# Altium schematic symbol library CUSTOM SCH - Copy.SchLib: 494 symbols (part 5 of 6) (continued)
## TPS62291DRVR
designator U?
Switching Voltage Regulators 2.25MHz 1A Step-Down Converter; Manufacturer: Texas Instruments; Output Voltage: 3.3V; Number of Outputs: 1; Max Input Voltage: 6V; Min Input Voltage: 2.3V; Synchronous Rectifier: Yes; Quiescent Current: 15uA; Output Type: Fixed; Output Configuration: Positive; Supplier 1: Digi-Key; Stock 1: 0; Number of Pins: 6; Weight: 0.000342oz; Min Operating Temperature: -40°C; Max Operating Temperature: 85°C; Switching Frequency: 2.25MHz; Output Current: 1A; Packaging: Tape and Reel; Package Quantity: 3000; Max Output Current: 1A; Min Output Voltage: 3.3V; Max Output Voltage: 3.3V; Operating Supply Voltage: 6V; Lead Free: Lead Free; ComponentLink1URL: http://www.ti.com/lit/ds/symlink/tps62293.pdf?src-supplier=Digi-Key; ComponentLink1Description: http://www.ti.com/lit/ds/symlink/tps62293.pdf?src-supplier=Digi-Key; ComponentLink2URL: http://www.ti.com/general/docs/lit/getliterature.tsp?genericPartNumber=TPS62291&&fileType=pdf&src-supplier=Avnet; ComponentLink2Description: http://www.ti.com/general/docs/lit/getliterature.tsp?genericPartNumber=TPS62291&&fileType=pdf&src-supplier=Avnet; ComponentLink3URL: http://components.arrow.com/part/dataview/43980678S8271694N7713?src-supplier=Arrow; ComponentLink3Description: http://components.arrow.com/part/dataview/43980678S8271694N7713?src-supplier=Arrow; Supplier Part Number 1: TPS62291DRVR-ND; Manufacturer Part Number: TPS62291DRVR
footprint WSON-6
pins: 1 SW, 2 MODE, 3 FB, 4 EN, 5 VIN (power), 6 GND (power), 7 EPAD

## TPS62827DMQR
designator U?
Manufacturer: Texas Instruments; Manufacturer Part Number: TPS62827DMQR; Pricing 1: 3000=0.8242, 6000=0.7925 (USD); Case/Package: VSON-6
footprint VSON-6
pins: 1 EN, 2 PG, 3 FB, 4 GND, 5 SW, 6 VIN

## TPS63021DSJR
designator U?
High Efficiency Single Inductor 3.3V, 2A Buck-Boost Converter with 4A Switching Current; Manufacturer Part Number: TPS63021DSJR; Case/Package: None
footprint TPS63021DSJR (TPS63021)
pins: 1 VINA (in), 2 GND (power), 3 FB (in), 4 VOUT_4 (out), 5 VOUT_5 (out), 6 L2_6, 7 L2_7, 8 L1_8, 9 L1_9, 10 VIN_10 (in), 11 VIN_11 (in), 12 EN (in), 13 PS/SYNC (in), 14 PG (out), 15 PGND (power)

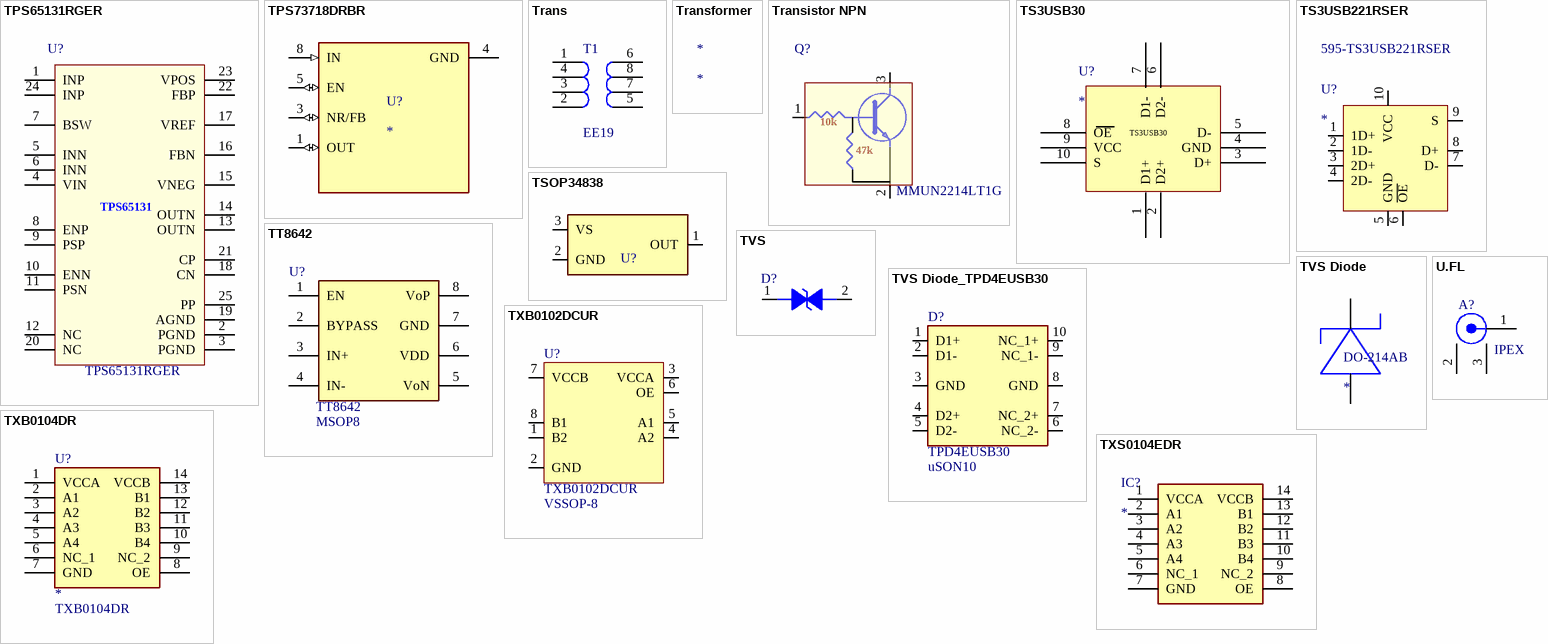
[diagram p42: symbols TPS65131RGER to U.FL]

## TPS65131RGER
designator U?  Manufacturer Part Number: TPS65131RGER
Positive and Negative Output DC-DC Converter; Manufacturer: Texas Instruments; Output Voltage: 15V; Output Current: 1.95A; Operating Supply Voltage: 5.5V; Number of Outputs: 2; Efficiency: 85%; Switching Frequency: 1.4MHz; Min Input Voltage: 2.7V; Synchronous Rectifier: No; Min Output Voltage: -15V; Quiescent Current: 500uA; Topology: Buck-Boost; Output Type: Adjustable; Supplier 1: Digi-Key; RoHS: Yes; Category: Voltage Regulators - Switching; Stock 1: 2825; Pricing 1: 1=2.80000, 10=2.51300, 25=2.37600, 100=1.95360, 250=1.75296, 500=1.68960, 1000=1.40448 (USD); Case/Package: VQFN-24; Number of Pins: 24; Weight: 0.001524oz; Min Operating Temperature: -40°C; Max Operating Temperature: 85°C; Package Quantity: 3000; Packaging: Tape and Reel; Max Input Voltage: 5.5V; Max Output Voltage: 15V; Radiation Hardening: No; Lead Free: Lead Free; ComponentLink1URL: https://datasheet.ciiva.com/4119/40762122s8213930n7713-4119696.pdf?src-supplier=Arrow+Electronics; ComponentLink1Description: https://datasheet.ciiva.com/4119/40762122s8213930n7713-4119696.pdf?src-supplier=Arrow+Electronics; ComponentLink2URL: https://datasheet.ciiva.com/2035/tps65130-2035332.pdf?src-supplier=Digi-Key; ComponentLink2Description: https://datasheet.ciiva.com/2035/tps65130-2035332.pdf?src-supplier=Digi-Key; ComponentLink3URL: https://datasheet.ciiva.com/15223/getdatasheetpartid-254483-15223079.pdf?src-supplier=Verical; ComponentLink3Description: https://datasheet.ciiva.com/15223/getdatasheetpartid-254483-15223079.pdf?src-supplier=Verical; ComponentLink4URL: https://datasheet.ciiva.com/14378/tps65130-14378346.pdf?src-supplier=Avnet; ComponentLink4Description: https://datasheet.ciiva.com/14378/tps65130-14378346.pdf?src-supplier=Avnet
pins: 1 INP, 2 PGND, 3 PGND, 4 VIN, 5 INN, 6 INN, 7 BSW, 8 ENP, 9 PSP, 10 ENN, 11 PSN, 12 NC, 13 OUTN, 14 OUTN, 15 VNEG, 16 FBN, 17 VREF, 18 CN, 19 AGND, 20 NC, 21 CP, 22 FBP, 23 VPOS, 24 INP, 25 PP
text: TPS65131

## TPS73718DRBR
designator U?
Manufacturer Part Number: TPS73718DRBR; Case/Package: SMD DRBR; Value: *
footprint DRV8601DRBT (TPS73718DRBR)
pins: 1 OUT (io), 3 NR/FB (io), 4 GND (power), 5 EN (io), 8 IN (in)

## Trans
designator T1, comment EE19
Transformer; Published: 24-Mar-1999; LatestRevisionDate: 08-Jul-2005; LatestRevisionNote: Mech Layer 1 removed.; PackageReference: TRANS; Publisher: Altium Limited; PackageDescription: Transformer; 4 Leads
footprint EE19 Transformer (DC/DC  converte)
footprint EE19 Transformer (DC/DC  converte)
pins: 1, 2, 3, 4 3, 5, 6, 7, 8

## Transformer
designator *

## Transistor NPN
designator Q?  Manufacturer Part Number: MMUN2214LT1G
Bipolar Transistors - Pre-Biased 100mA 50V BRT NPN; Manufacturer: ON Semiconductor; Max Power Dissipation: 246mW; hFE Min: 80; Collector Emitter Saturation Voltage: 250mV; Element Configuration: Single; Supplier 1: Mouser; Stock 1: 56410; Pricing 1: 1=0.12, 10=0.105, 50=0.105, 100=0.037, 1000=0.025, 10000=0.017 (USD); Case/Package: SOT-23-3; Number of Pins: 3; Contact Plating: Tin,Matte; Min Operating Temperature: -55°C; Max Operating Temperature: 150°C; Package Quantity: 1; Collector Emitter Voltage (VCEO): 50V; Packaging: Tape and Reel; Max Collector Current: 100mA; Collector Emitter Breakdown Voltage: 50V; Polarity: NPN; Max Breakdown Voltage: 50V; Max Output Current: 100mA; Operating Supply Voltage: 50V; Continuous Collector Current: 100mA; Power Dissipation: 246mW; Voltage Rating (DC): 50V; Current Rating: 100mA; Length: 2.9mm; Height: 0.94mm; Width: 1.3mm; Radiation Hardening: No; Lead Free: Lead Free; Halogen Free: Halogen Free; REACH SVHC: No SVHC; ComponentLink1URL: http://www.onsemi.ru.com/pub/Collateral/DTC114Y-D.PDF?src-supplier=Avnet+Europe; ComponentLink1Description: http://www.onsemi.ru.com/pub/Collateral/DTC114Y-D.PDF?src-supplier=Avnet+Europe; ComponentLink2URL: https://www.verical.com/server-webapp/html/getDatasheet?partID=38473&src-supplier=Verical; ComponentLink2Description: https://www.verical.com/server-webapp/html/getDatasheet?partID=38473&src-supplier=Verical; ComponentLink3URL: http://www.onsemi.com/pub/Collateral/DTC114Y-D.PDF?src-supplier=Digi-Key; ComponentLink3Description: http://www.onsemi.com/pub/Collateral/DTC114Y-D.PDF?src-supplier=Digi-Key; ComponentLink4URL: http://www.onsemi.com/pub/Collateral/DTC114Y-D.PDF?src-supplier=Future+Electronics; ComponentLink4Description: http://www.onsemi.com/pub/Collateral/DTC114Y-D.PDF?src-supplier=Future+Electronics; Supplier Part Number 1: 863-MMUN2214LT1G
footprint SOT95P240X115-3N
pins: 1 B, 2 E, 3 C
text: 10k; 47k

## TS3USB30
designator U?
ComponentLink1URL: http://www.ti.com/lit/ds/symlink/ts3usb30e.pdf?src-supplier=Digi-Key; ComponentLink1Description: http://www.ti.com/lit/ds/symlink/ts3usb30e.pdf?src-supplier=Digi-Key; ComponentLink2URL: http://www.farnell.com/datasheets/1719749.pdf?src-supplier=Element14; ComponentLink2Description: http://www.farnell.com/datasheets/1719749.pdf?src-supplier=Element14; ComponentLink3URL: http://focus.ti.com/lit/ds/symlink/ts3usb30e.pdf?src-supplier=Avnet; ComponentLink3Description: http://focus.ti.com/lit/ds/symlink/ts3usb30e.pdf?src-supplier=Avnet; ComponentLink4URL: https://www.verical.com/server-webapp/html/getDatasheet?partID=298587&src-supplier=Verical; ComponentLink4Description: https://www.verical.com/server-webapp/html/getDatasheet?partID=298587&src-supplier=Verical; ComponentLink5URL: http://focus.ti.com/lit/ds/symlink/ts3usb30e.pdf?src-supplier=Avnet+Europe; ComponentLink5Description: http://focus.ti.com/lit/ds/symlink/ts3usb30e.pdf?src-supplier=Avnet+Europe; ComponentLink6URL: http://www.farnell.com/datasheets/1882195.pdf?src-supplier=Element14; ComponentLink6Description: http://www.farnell.com/datasheets/1882195.pdf?src-supplier=Element14; ComponentLink7URL: http://datasheet.iiic.cc/texas_instruments/TS3USB30ERSWR.pdf?src-supplier=IIIC; ComponentLink7Description: http://datasheet.iiic.cc/texas_instruments/TS3USB30ERSWR.pdf?src-supplier=IIIC; ComponentLink8URL: http://www.produktinfo.conrad.com/datenblaetter/1100000-1199999/001187336-da-01-en-IC_USB_SWITCH_TS3USB30ERSWR_UQFN_10_TID.pdf?src-supplier=Conrad; ComponentLink8Description: http://www.produktinfo.conrad.com/datenblaetter/1100000-1199999/001187336-da-01-en-IC_USB_SWITCH_TS3USB30ERSWR_UQFN_10_TID.pdf?src-supplier=Conrad; ComponentLink9URL: http://www.ti.com/lit/ds/scds220g/scds220g.pdf?src-supplier=Avnet; ComponentLink9Description: http://www.ti.com/lit/ds/scds220g/scds220g.pdf?src-supplier=Avnet; ComponentLink10URL: http://www.ti.com/lit/ds/symlink/ts3usb221.pdf?src-supplier=Digi-Key; ComponentLink10Description: http://www.ti.com/lit/ds/symlink/ts3usb221.pdf?src-supplier=Digi-Key
footprint UQFN_TS3USB30
pins: 1 D1+, 2 D2+, 3 D+, 4 GND, 5 D-, 6 D2-, 7 D1-, 8 OE, 9 VCC, 10 S

## TS3USB221RSER
designator U?  Supplier Part Number 1: 595-TS3USB221RSER
USB Switch ICs Hi-Sp USB 2.0 1:2 Multipl/Demult Sw; Manufacturer: Texas Instruments; Manufacturer Part Number: TS3USB221RSER; Data Rate: 480Mbps; Number of Channels: 2; Min Supply Voltage: 2.3V; Max Supply Voltage: 3.6V; Bandwidth: 1.1GHz; Number of Inputs: 4; Operating Supply Voltage: 3V; Nominal Supply Current: 30uA; Turn-Off Delay Time: 12ns; On-State Resistance: 6R; Turn-On Delay Time: 30ns; Supply Type: Single; High Level Output Current: 64mA; USB Standard: USB 2.0; Supplier 1: Mouser; Stock 1: 25822; Pricing 1: 1=1.12, 10=0.952, 50=0.952, 100=0.732, 1000=0.51, 10000=0.436 (USD); Case/Package: UQFN-10; Number of Pins: 10; Weight: 0.000247oz; Contact Plating: Gold; Min Operating Temperature: -40°C; Max Operating Temperature: 85°C; Packaging: Tape and Reel; Number of Outputs: 2; Package Quantity: 1; Operating Supply Current: 30uA; Number of Ports: 2; Length: 1.5mm; Height: 0.55mm; Width: 2mm; Radiation Hardening: No; Lead Free: Lead Free; REACH SVHC: No SVHC; ComponentLink1URL: http://www.ti.com/lit/gpn/ts3usb221?src-supplier=Mouser; ComponentLink1Description: http://www.ti.com/lit/gpn/ts3usb221?src-supplier=Mouser; ComponentLink2URL: http://www.ti.com/lit/ds/symlink/ts3usb221.pdf?src-supplier=Digi-Key; ComponentLink2Description: http://www.ti.com/lit/ds/symlink/ts3usb221.pdf?src-supplier=Digi-Key; ComponentLink3URL: http://www.farnell.com/datasheets/2019041.pdf?src-supplier=Element14; ComponentLink3Description: http://www.farnell.com/datasheets/2019041.pdf?src-supplier=Element14; ComponentLink4URL: http://www.farnell.com/datasheets/1908158.pdf?src-supplier=Element14; ComponentLink4Description: http://www.farnell.com/datasheets/1908158.pdf?src-supplier=Element14; ComponentLink5URL: http://www.ti.com/general/docs/lit/getliterature.tsp?genericPartNumber=TS3USB221&&fileType=pdf&src-supplier=Element14; ComponentLink5Description: http://www.ti.com/general/docs/lit/getliterature.tsp?genericPartNumber=TS3USB221&&fileType=pdf&src-supplier=Element14; ComponentLink6URL: https://www.verical.com/server-webapp/html/getDatasheet?partID=48047&src-supplier=Verical; ComponentLink6Description: https://www.verical.com/server-webapp/html/getDatasheet?partID=48047&src-supplier=Verical; ComponentLink7URL: http://www.produktinfo.conrad.com/datenblaetter/1100000-1199999/001187309-da-01-en-IC_USB_SWITCH_TS3USB221RSER_UQFN_10_TID.pdf?src-supplier=Conrad; ComponentLink7Description: http://www.produktinfo.conrad.com/datenblaetter/1100000-1199999/001187309-da-01-en-IC_USB_SWITCH_TS3USB221RSER_UQFN_10_TID.pdf?src-supplier=Conrad
footprint UQFN-10TS3USB221RSER
pins: 1 1D+, 2 1D-, 3 2D+, 4 2D-, 5 GND, 6 ~{OE}, 7 D-, 8 D+, 9 S, 10 VCC

## TSOP34838
designator U?  (value not drawn)
Through Hole Infrared remote receiver.; Manufacturer Part Number: TSOP34838; Case/Package: Through Hole
footprint tsop34838
pins: 1 OUT, 2 GND, 3 VS

## TT8642
designator U?  Manufacturer Part Number: TT8642  Case/Package: MSOP8
1.5W Filter-free Class D Audio Power Amplifier
footprint MSOP-8
pins: 1 EN, 2 BYPASS, 3 IN+, 4 IN-, 5 VoN, 6 VDD, 7 GND, 8 VoP

## TVS
designator D?
ComponentLink1URL: http://www.littelfuse.com/~/media/electronics/datasheets/tvs_diodes/littelfuse_tvs_diode_smaj_datasheet.pdf.pdf?src-supplier=Digi-Key; ComponentLink1Description: http://www.littelfuse.com/~/media/electronics/datasheets/tvs_diodes/littelfuse_tvs_diode_smaj_datasheet.pdf.pdf?src-supplier=Digi-Key; ComponentLink2URL: http://www.littelfuse.com/data/en/Data_Sheets/Littelfuse_TVS-Diode_SMAJ.pdf?src-supplier=Future+Electronics; ComponentLink2Description: http://www.littelfuse.com/data/en/Data_Sheets/Littelfuse_TVS-Diode_SMAJ.pdf?src-supplier=Future+Electronics; ComponentLink3URL: https://datasheet.ciiva.com/16302/littelfuse-pulseguard-pgb1-datasheet-259083-16302362.pdf?src-supplier=Mouser; ComponentLink3Description: https://datasheet.ciiva.com/16302/littelfuse-pulseguard-pgb1-datasheet-259083-16302362.pdf?src-supplier=Mouser; ComponentLink4URL: https://datasheet.ciiva.com/15063/littelfuse-pulseguard-esd-pgb1-15063995.pdf?src-supplier=Digi-Key; ComponentLink4Description: https://datasheet.ciiva.com/15063/littelfuse-pulseguard-esd-pgb1-15063995.pdf?src-supplier=Digi-Key; ComponentLink5URL: https://datasheet.ciiva.com/15063/littelfuse-pulseguard-esd-pgb1-15063996.pdf?src-supplier=Digi-Key; ComponentLink5Description: https://datasheet.ciiva.com/15063/littelfuse-pulseguard-esd-pgb1-15063996.pdf?src-supplier=Digi-Key; ComponentLink6URL: https://datasheet.ciiva.com/15063/littelfuse-pulseguard-esd-pgb1-15063997.pdf?src-supplier=Digi-Key; ComponentLink6Description: https://datasheet.ciiva.com/15063/littelfuse-pulseguard-esd-pgb1-15063997.pdf?src-supplier=Digi-Key; ComponentLink7URL: https://datasheet.ciiva.com/46428/1486684-46428670.pdf?src-supplier=Element14; ComponentLink7Description: https://datasheet.ciiva.com/46428/1486684-46428670.pdf?src-supplier=Element14; ComponentLink8URL: https://datasheet.ciiva.com/46428/1486684-46428671.pdf?src-supplier=Element14; ComponentLink8Description: https://datasheet.ciiva.com/46428/1486684-46428671.pdf?src-supplier=Element14
pins: 1, 2

## TVS Diode
designator DO-214AB
Diode Schottky 40V 4A Surface Mount SMC; MF: Littelfuse Inc.; MP: DO-214AB; SnapEDA_Link: https://www.snapeda.com/parts/DO-214AB/Littelfuse%20Inc./view-part/2598086/?ref=snap; Price: None; Package: DO-214AB-214 Littelfuse Inc.; Availability: Unavailable; Value: *
footprint DO-214AB
pins: IN, OUT

## TVS Diode_TPD4EUSB30
designator D?  Manufacturer Part Number: TPD4EUSB30  Case/Package: uSON10
TVS DIODE 5.5V 8V 10SON
footprint uSON-10
footprint uSON-10
pins: 1 D1+, 2 D1-, 3 GND (power), 4 D2+, 5 D2-, 6 NC_2-, 7 NC_2+, 8 GND (power), 9 NC_1-, 10 NC_1+

## TXB0102DCUR
designator U?  Case/Package: VSSOP-8  (hidden comment: TXB0102DCUR)
BI-DIRECTIONAL VOLTAGE LEVEL XLATOR, VSSOP-8; Manufacturer: Texas Instruments; Max Supply Voltage: 5.5V; Min Supply Voltage: 1.2V; Propagation Delay: 31ns; Data Rate: 100Mbps; Number of Channels: 2; Logic Function: Translator; Turn-On Delay Time: 7.4ns; High Level Output Current: -20uA; Low Level Output Current: 20uA; Supplier 1: Digi-Key; RoHS: Yes; Category: Logic Gates; Stock 1: 14327; Pricing 1: 1=0.76000, 10=0.66500, 25=0.62440, 100=0.50950, 250=0.47328, 500=0.40280, 1000=0.29606 (USD); Mount: Surface Mount; Number of Pins: 8; Weight: 0.000339oz; Contact Plating: Gold; Min Operating Temperature: -40°C; Max Operating Temperature: 85°C; Packaging: Tape and Reel; Package Quantity: 1; Number of Bits: 2; Radiation Hardening: No; Lead Free: Lead Free; REACH SVHC: No SVHC; ComponentLink1URL: https://datasheet.ciiva.com/4226/sces641b-4226960.pdf?src-supplier=Arrow+Electronics; ComponentLink1Description: https://datasheet.ciiva.com/4226/sces641b-4226960.pdf?src-supplier=Arrow+Electronics; ComponentLink2URL: https://datasheet.ciiva.com/7744/1634161-7744195.pdf?src-supplier=Element14; ComponentLink2Description: https://datasheet.ciiva.com/7744/1634161-7744195.pdf?src-supplier=Element14; ComponentLink3URL: https://datasheet.ciiva.com/22677/1699360-22677930.pdf?src-supplier=Element14; ComponentLink3Description: https://datasheet.ciiva.com/22677/1699360-22677930.pdf?src-supplier=Element14; ComponentLink4URL: https://datasheet.ciiva.com/15096/getdatasheetpartid-214907-15096235.pdf?src-supplier=Verical; ComponentLink4Description: https://datasheet.ciiva.com/15096/getdatasheetpartid-214907-15096235.pdf?src-supplier=Verical; ComponentLink5URL: https://datasheet.ciiva.com/1899/txb0102-1899430.pdf?src-supplier=Digi-Key; ComponentLink5Description: https://datasheet.ciiva.com/1899/txb0102-1899430.pdf?src-supplier=Digi-Key; ComponentLink6URL: https://datasheet.ciiva.com/46384/1874809-46384198.pdf?src-supplier=Element14; ComponentLink6Description: https://datasheet.ciiva.com/46384/1874809-46384198.pdf?src-supplier=Element14; ComponentLink7URL: https://datasheet.ciiva.com/1899/txb0102-1899431.pdf?src-supplier=Digi-Key; ComponentLink7Description: https://datasheet.ciiva.com/1899/txb0102-1899431.pdf?src-supplier=Digi-Key; ComponentLink8URL: https://datasheet.ciiva.com/1899/txb0102-1899429.pdf?src-supplier=Digi-Key; ComponentLink8Description: https://datasheet.ciiva.com/1899/txb0102-1899429.pdf?src-supplier=Digi-Key; ComponentLink9URL: https://datasheet.ciiva.com/14287/txb0102-14287496.pdf?src-supplier=Avnet; ComponentLink9Description: https://datasheet.ciiva.com/14287/txb0102-14287496.pdf?src-supplier=Avnet; ComponentLink10URL: https://datasheet.ciiva.com/26039/txb0102-26039290.pdf?src-supplier=Avnet+Europe; ComponentLink10Description: https://datasheet.ciiva.com/26039/txb0102-26039290.pdf?src-supplier=Avnet+Europe; ComponentLink11URL: https://datasheet.ciiva.com/6132/txb0102-6132717.pdf?src-supplier=Farnell; ComponentLink11Description: https://datasheet.ciiva.com/6132/txb0102-6132717.pdf?src-supplier=Farnell; Supplier Part Number 1: 296-22862-1-ND; Manufacturer Part Number: TXB0102DCUR
footprint VSSOP-8
pins: 1 B2, 2 GND, 3 VCCA, 4 A2, 5 A1, 6 OE, 7 VCCB, 8 B1

## TXB0104DR
designator U?  Manufacturer Part Number: TXB0104DR
4-Bit Bidirectional Voltage Level Shifter with Auto Direction Sensing and +/-15 kV ESD Protect; Manufacturer_Name: Texas Instruments; Mouser Part Number: 595-TXB0104DR
footprint SOIC127P600X175-14N
pins: 1 VCCA, 2 A1, 3 A2, 4 A3, 5 A4, 6 NC_1, 7 GND, 8 OE, 9 NC_2, 10 B4, 11 B3, 12 B2, 13 B1, 14 VCCB

## TXS0104EDR
designator IC?
4-Bit Bidirectional Voltage Level Shifter; Manufacturer_Name: Texas Instruments; Manufacturer Part Number: TXS0104EDR; Datasheet Link: http://www.ti.com/lit/gpn/txs0104e; Mouser Part Number: 595-TXS0104EDR
footprint SOIC127P600X175-14N
pins: 1 VCCA, 2 A1, 3 A2, 4 A3, 5 A4, 6 NC_1, 7 GND, 8 OE, 9 NC_2, 10 B4, 11 B3, 12 B2, 13 B1, 14 VCCB

## U.FL
designator A?, comment IPEX
CONN UMC JACK STR SMD U FL Connector; Manufacturer Part Number: CONUFL001-SMD-T; Case/Package: CONN UMC JACK STR SMD; ComponentLink1URL: https://media.digikey.com/pdf/Data%20Sheets/Linx%20Technologies%20PDFs/CONUFL001-SMD_T_Dwg_RevB_5-15-17.pdf?src-supplier=Digi-Key; ComponentLink1Description: https://media.digikey.com/pdf/Data%20Sheets/Linx%20Technologies%20PDFs/CONUFL001-SMD_T_Dwg_RevB_5-15-17.pdf?src-supplier=Digi-Key
footprint u.FL
footprint u.fl_ESP
pins: 1 RF, 2 GND1, 3 GND2

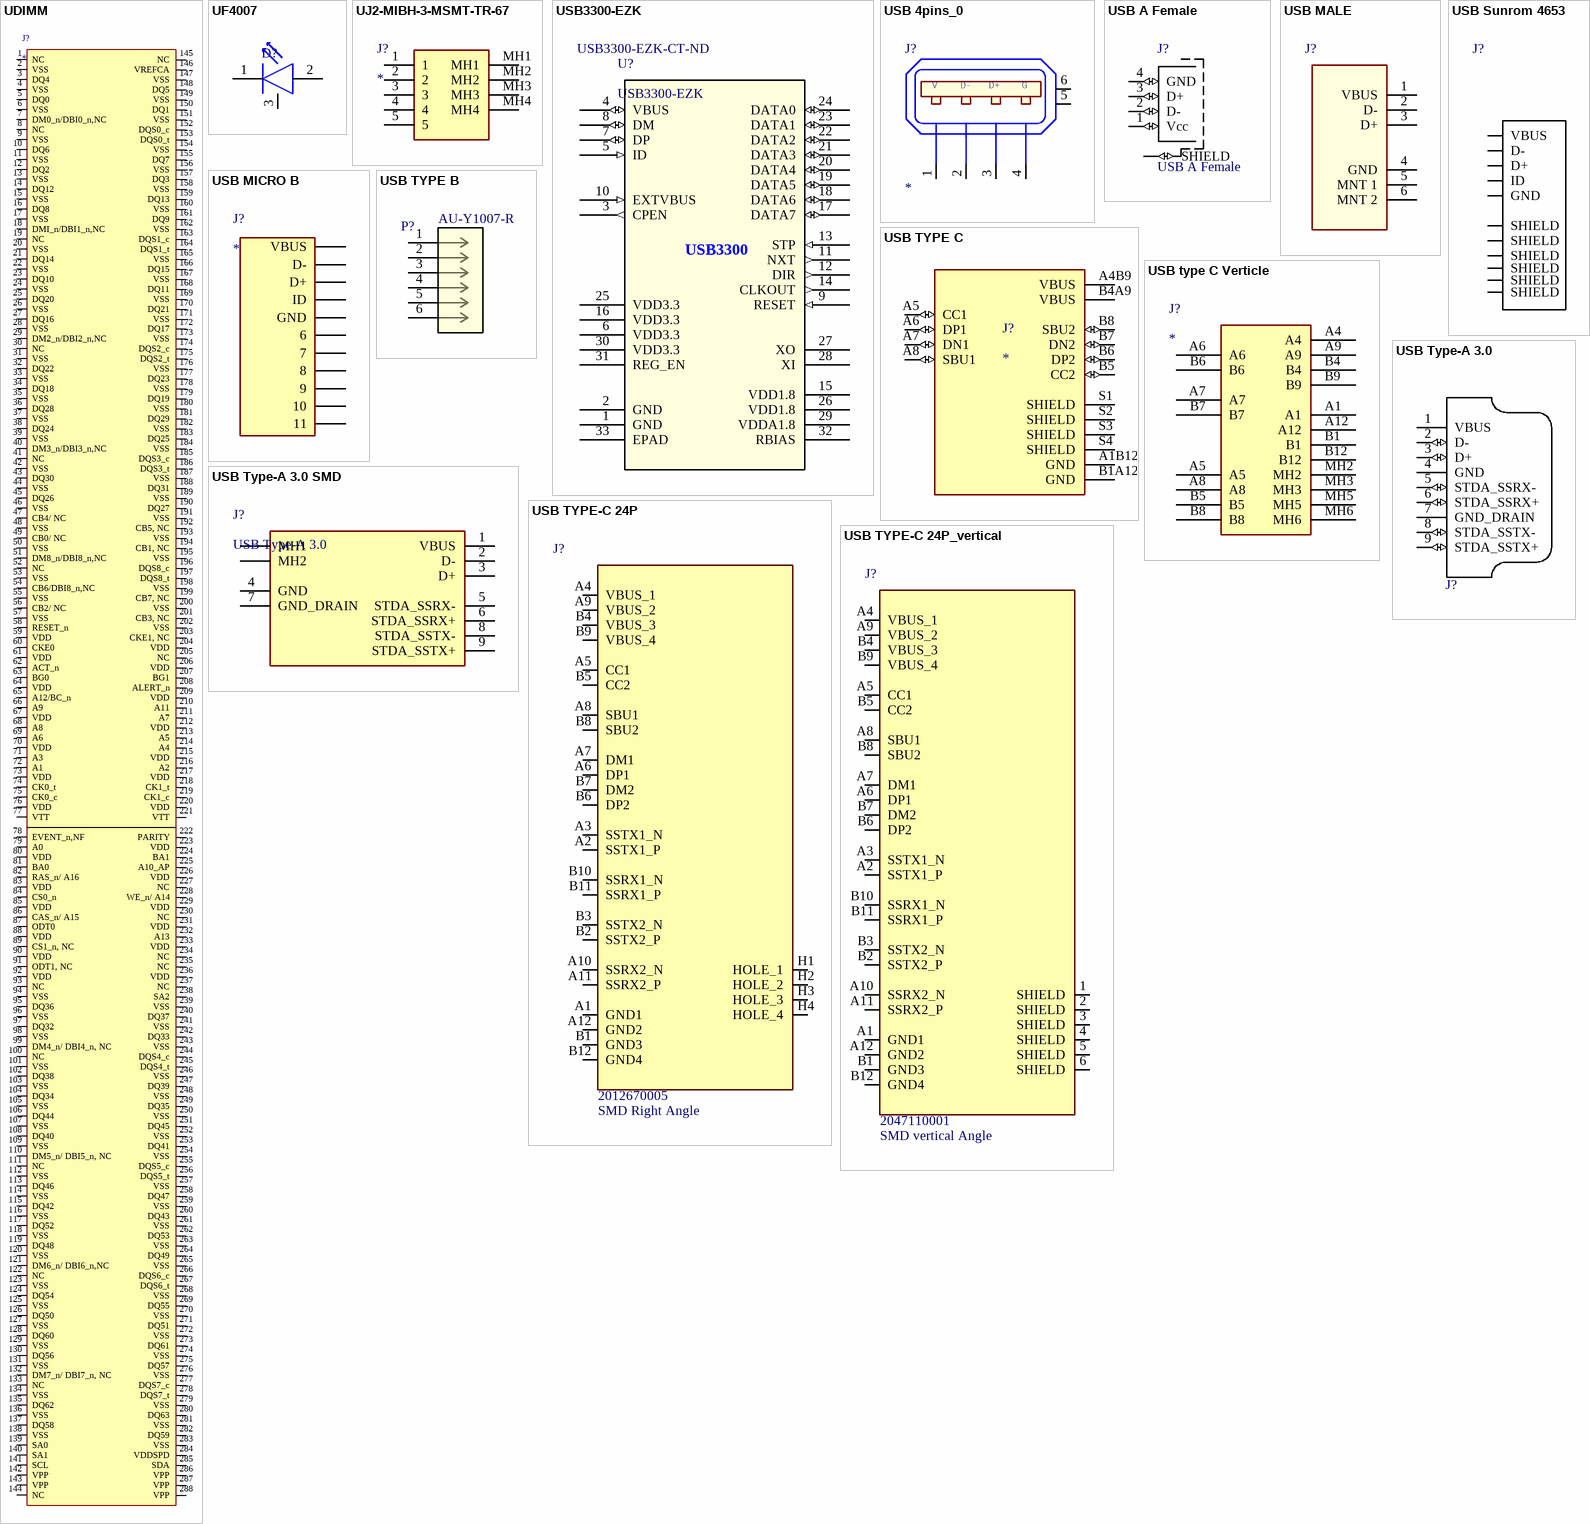
[diagram p43: symbols UDIMM to USB TYPE-C 24P_vertical]

## UDIMM
designator J?
Manufacturer Part Number: *; Case/Package: *
pins: 1 NC, 2 VSS, 3 DQ4, 4 VSS, 5 DQ0, 6 VSS, 7 DM0_n/DBI0_n,NC, 8 NC, 9 VSS, 10 DQ6, 11 VSS, 12 DQ2, 13 VSS, 14 DQ12, 15 VSS, 16 DQ8, 17 VSS, 18 DMI_n/DBI1_n,NC, 19 NC, 20 VSS, 21 DQ14, 22 VSS, 23 DQ10, 24 VSS, 25 DQ20, 26 VSS, 27 DQ16, 28 VSS, 29 DM2_n/DBI2_n,NC, 30 NC, 31 VSS, 32 DQ22, 33 VSS, 34 DQ18, 35 VSS, 36 DQ28, 37 VSS, 38 DQ24, 39 VSS, 40 DM3_n/DBI3_n,NC, 41 NC, 42 VSS, 43 DQ30, 44 VSS, 45 DQ26, 46 VSS, 47 CB4/ NC, 48 VSS, 49 CB0/ NC, 50 VSS, 51 DM8_n/DBI8_n,NC, 52 NC, 53 VSS, 54 CB6/DBI8_n,NC, 55 VSS, 56 CB2/ NC, 57 VSS, 58 RESET_n, 59 VDD, 60 CKE0, 61 VDD, 62 ACT_n, 63 BG0, 64 VDD, 65 A12/BC_n, 66 A9, 67 VDD, 68 A8, 69 A6, 70 VDD, 71 A3, 72 A1, 73 VDD, 74 CK0_t, 75 CK0_c, 76 VDD, 77 VTT, 78 EVENT_n,NF, 79 A0, 80 VDD, 81 BA0, 82 RAS_n/ A16, 83 VDD, 84 CS0_n, 85 VDD, 86 CAS_n/ A15, 87 ODT0, 88 VDD, 89 CS1_n, NC, 90 VDD, 91 ODT1, NC, 92 VDD, 93 NC, 94 VSS, 95 DQ36, 96 VSS, 97 DQ32, 98 VSS, 99 DM4_n/ DBI4_n, NC, 100 NC, 101 VSS, 102 DQ38, 103 VSS, 104 DQ34, 105 VSS, 106 DQ44, 107 VSS, 108 DQ40, 109 VSS, 110 DM5_n/ DBI5_n, NC, 111 NC, 112 VSS, 113 DQ46, 114 VSS, 115 DQ42, 116 VSS, 117 DQ52, 118 VSS, 119 DQ48, 120 VSS, 121 DM6_n/ DBI6_n,NC, 122 NC, 123 VSS, 124 DQ54, 125 VSS, 126 DQ50, 127 VSS, 128 DQ60, 129 VSS, 130 DQ56, 131 VSS, 132 DM7_n/ DBI7_n, NC, 133 NC, 134 VSS, 135 DQ62, 136 VSS, 137 DQ58, 138 VSS, 139 SA0, 140 SA1, 141 SCL, 142 VPP, 143 VPP, 144 NC, 145 NC, 146 VREFCA, 147 VSS, 148 DQ5, 149 VSS, 150 DQ1, 151 VSS, 152 DQS0_c, 153 DQS0_t, 154 VSS, 155 DQ7, 156 VSS, 157 DQ3, 158 VSS, 159 DQ13, 160 VSS, 161 DQ9, 162 VSS, 163 DQS1_c, 164 DQS1_t, 165 VSS, 166 DQ15, 167 VSS, 168 DQ11, 169 VSS, 170 DQ21, 171 VSS, 172 DQ17, 173 VSS, 174 DQS2_c, 175 DQS2_t, 176 VSS, 177 DQ23, 178 VSS, 179 DQ19, 180 VSS, 181 DQ29, 182 VSS, 183 DQ25, 184 VSS, 185 DQS3_c, 186 DQS3_t, 187 VSS, 188 DQ31, 189 VSS, 190 DQ27, 191 VSS, 192 CB5, NC, 193 VSS, 194 CB1, NC, 195 VSS, 196 DQS8_c, 197 DQS8_t, 198 VSS, 199 CB7, NC, 200 VSS, 201 CB3, NC, 202 VSS, 203 CKE1, NC, 204 VDD, 205 NC, 206 VDD, 207 BG1, 208 ALERT_n, 209 VDD, 210 A11, 211 A7, 212 VDD, 213 A5, 214 A4, 215 VDD, 216 A2, 217 VDD, 218 CK1_t, 219 CK1_c, 220 VDD, 221 VTT, 222 PARITY, 223 VDD, 224 BA1, 225 A10_AP, 226 VDD, 227 NC, 228 WE_n/ A14, 229 VDD, 230 NC, 231 VDD, 232 A13, 233 VDD, 234 NC, 235 NC, 236 VDD, 237 NC, 238 SA2, 239 VSS, 240 DQ37, 241 VSS, 242 DQ33, 243 VSS, 244 DQS4_c, 245 DQS4_t, 246 VSS, 247 DQ39, 248 VSS, 249 DQ35, 250 VSS, 251 DQ45, 252 VSS, 253 DQ41, 254 VSS, 255 DQS5_c, 256 DQS5_t, 257 VSS, 258 DQ47, 259 VSS, 260 DQ43, 261 VSS, 262 DQ53, 263 VSS, 264 DQ49, 265 VSS, 266 DQS6_c, 267 DQS6_t, 268 VSS, 269 DQ55, 270 VSS, 271 DQ51, 272 VSS, 273 DQ61, 274 VSS, 275 DQ57, 276 VSS, 277 DQS7_c, 278 DQS7_t, 279 VSS, 280 DQ63, 281 VSS, 282 DQ59, 283 VSS, 284 VDDSPD, 285 SDA, 286 VPP, 287 VPP, 288 VPP
